# Altium footprint library USB&Type C.PcbLib: 17 footprints (part 1 of 2)
Each footprint in its own frame and in the unit in brackets; x right, y up, seen from the top. Pads: shape width x height; smd on the part's side, far side on the other; paste and mask are expansions set on the pad; w line width, h text height; cw(c..) or ccw(c..) is an arc to the next point about the centre after c.
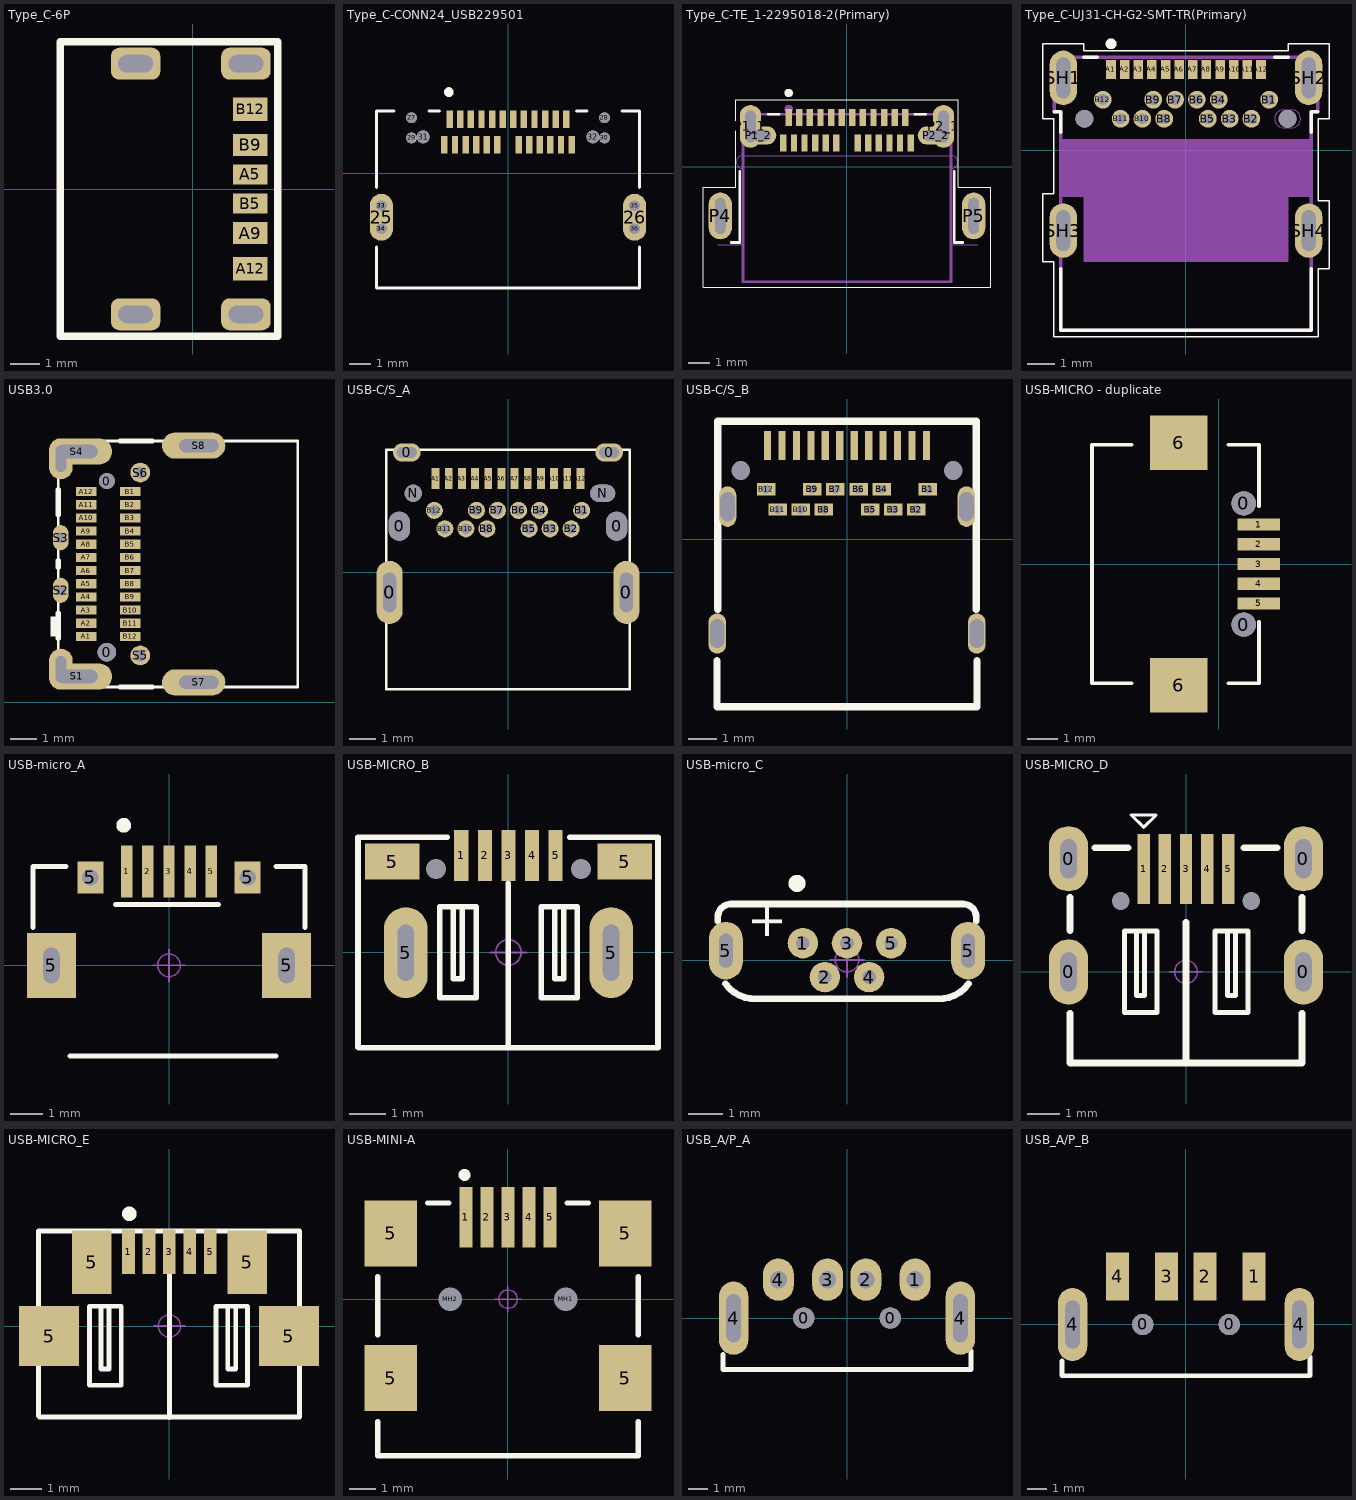
[diagram p0: the footprints below, top view; thin cyan lines are the x and y axes]

## Type_C-6P [mm]
pads (10):
  rect 1.2x0.7 smd: A5(1.975,0.5) B5(1.975,-0.5)
  rect 1.2x0.76 smd: A9(1.975,-1.52) B9(1.975,1.52)
  rect 1.2x0.8 smd: A12(1.975,-2.75) B12(1.975,2.75)
  rrect50% 1.7x1.1 hole 0.6 slot 1.2 at 0 deg: ""(-1.975,-4.32) ""(-1.975,4.32) ""(1.825,-4.32) ""(1.825,4.32)
Top Overlay:
  lines w0.254: -4.572,-5.08 2.921,-5.08 2.921,5.08 -4.572,5.08 -4.572,-5.08
3D body "USB TYPE-C 3.1smple.STEP": height 3.18, standoff -0.9, extent -4.614,-4.47 2.286,4.47

## Type_C-CONN24_USB229501 [mil]
pads (38):
  oval 43x87 smd: 25(-235.04,-81.67) 26(235.04,-81.67)
  round 20 hole 20: 27(-179.13,103.17) 28(179.13,103.17) 29(-179.13,65.73) 30(179.13,65.73) 33(-235.04,-60.17) 33(-235.04,-60.17) 34(-235.04,-103.17) 34(-235.04,-103.17) 35(235.04,-60.17) 36(235.04,-103.17)
  round 24 hole 24: 31(-157.48,67.74) 32(157.48,67.74)
  rect 12x32 smd paste+0 mask+0: A1(-108.27,100.38) A2(-88.58,100.38) A3(-68.9,100.38) A4(-49.21,100.38) A5(-29.53,100.38) A6(-9.84,100.38) A7(9.84,100.38) A8(29.53,100.38) A9(49.21,100.38) A10(68.9,100.38) A11(88.58,100.38) A12(108.27,100.38) B1(118.11,53.13) B2(98.43,53.13) B3(78.74,53.13) B4(59.06,53.13) B5(39.37,53.13) B6(19.68,53.13) B7(-19.68,53.13) B8(-39.37,53.13) B9(-59.06,53.13) B10(-78.74,53.13) B11(-98.43,53.13) B12(-118.11,53.13)
Top Overlay:
  circle w10: c-110,150.85 r4
  lines w6: -244,-137.09 -244,-213.15 244,-213.15 244,-137.09 ; -244,-26.25 -244,115.85 -212.23,115.85 ; -146.03,115.85 -127.1,115.85 ; 127.1,115.85 146.03,115.85 ; 212.23,115.85 244,115.85 244,-26.25
Bottom Overlay:
  circle w10: c-110,150.85 r4
Mechanical 13:
  circle w5: c-110,150.85 r4
Multi-Layer:
  lines w1: -189.13,65.73 -189.13,103.17 ; -179.13,55.73 -157.48,55.74 ; -169.13,103.17 -169.13,79.74 -157.48,79.74 ; 157.48,55.74 179.13,55.73 ; 157.48,79.74 169.13,79.74 169.13,103.17 ; 189.13,65.73 189.13,103.17 ; -245.04,-103.17 -245.04,-60.17 -245.04,-103.17 ; -225.04,-103.17 -225.04,-60.17 -225.04,-103.17 ; -194,-208.15 -194,19.85 194,19.85 194,-208.15 -194,-208.15 ; 225.04,-103.17 225.04,-60.17 225.04,-103.17 ; 245.04,-103.17 245.04,-60.17 245.04,-103.17
3D body "c-2295018-2-a-3d.stp": height 96.06, standoff -45.67, extent -238.97,-205.01 238.99,113.69

## Type_C-TE_1-2295018-2(Primary) [mm]
pads (30):
  rect 0.3x0.8 smd: A1(-2.75,2.315) A2(-2.25,2.315) A3(-1.75,2.315) A4(-1.25,2.315) A5(-0.75,2.315) A6(-0.25,2.315) A7(0.25,2.315) A8(0.75,2.315) A9(1.25,2.315) A10(1.75,2.315) A11(2.25,2.315) A12(2.75,2.315) B1(3,1.115) B2(2.5,1.115) B3(2,1.115) B4(1.5,1.115) B5(1,1.115) B6(0.5,1.115) B7(-0.5,1.115) B8(-1,1.115) B9(-1.5,1.115) B10(-2,1.115) B11(-2.5,1.115) B12(-3,1.115)
  oval 1.008x2.016 hole 0.5 slot 1.5 at 90 deg: P1_1(-4.55,1.905) P2_1(4.55,1.905)
  oval 1.716x0.858 hole 0.5 slot 1.2 at 0 deg: P1_2(-4.191,1.48) P2_2(4.191,1.48)
  oval 1.1x2.2 hole 0.5 slot 1.7 at 90 deg: P4(-5.97,-2.315) P5(5.97,-2.315)
Top Overlay:
  circle w0.2: c-2.75,3.48 r0.1
  lines w0.05: -6.77,-5.67 -6.77,-0.965 -5.25,-0.965 -5.25,3.165 5.25,3.165 5.25,-0.965 6.77,-0.965 6.77,-5.67 -6.77,-5.67
  lines w0.127: -5.45,-3.565 -5.05,-3.565 -5.05,-0.215 ; -3.7,2.48 -3.2,2.48 ; 3.2,2.48 3.7,2.48 ; 5.05,-0.215 5.05,-3.565 5.45,-3.565
Mechanical 1:
  lines w0: -6.09,-3.675 -4.92,-3.675 -4.92,-0.075 cw(c-4.92,0.225) -5.22,0.225 cw(c-4.92,0.225) -4.92,0.525 4.93,0.525 cw(c4.925,0.23) 5.22,0.225 ; -4.005,1.78 -4.155,1.78 cw(c-4.15,1.93) -4.3,1.935 -4.3,2.38 ccw(c-4.55,2.38) -4.55,2.63 ccw(c-4.55,2.38) -4.8,2.38 -4.8,1.43 ccw(c-4.55,1.43) -4.55,1.18 -4,1.18 ccw(c-4,1.48) -3.7,1.48 ; -4.002,1.78 cw(c-4.002,1.478) -3.7,1.478 ; 4.919,-0.075 ccw(c4.929,0.216) 5.22,0.226 ; 4.92,-0.075 4.92,-3.675 6.17,-3.675 ; -6.22,-2.865 ccw(c-5.97,-2.865) -5.97,-3.115 ccw(c-5.97,-2.865) -5.72,-2.865 -5.72,-1.765 ccw(c-5.97,-1.765) -5.97,-1.515 ccw(c-5.97,-1.765) -6.22,-1.765 -6.22,-2.865 ; 3.7,1.48 ccw(c4,1.48) 4,1.18 4.55,1.18 ccw(c4.55,1.43) 4.8,1.43 4.8,2.38 ccw(c4.55,2.38) 4.55,2.63 ccw(c4.55,2.38) 4.3,2.38 4.3,1.935 cw(c4.15,1.93) 4.155,1.78 4,1.78 ccw(c4,1.48) 3.7,1.48 ; 5.72,-2.865 ccw(c5.97,-2.865) 5.97,-3.115 ccw(c5.97,-2.865) 6.22,-2.865 6.22,-1.765 ccw(c5.97,-1.765) 5.97,-1.515 ccw(c5.97,-1.765) 5.72,-1.765 5.72,-2.865
Mechanical 4:
  circle w0.2: c-2.75,2.72 r0.1
  circle w0.2: c-2.75,2.72 r0.1
  lines w0.127: -4.9,-5.42 -4.9,2.48 ; -4.9,-5.42 4.9,-5.42 ; -4.9,-5.42 -4.9,2.48 ; -4.9,-5.42 4.9,-5.42 ; -4.9,2.48 4.9,2.48 ; -4.9,2.48 4.9,2.48 ; 4.9,-5.42 4.9,2.48 ; 4.9,-5.42 4.9,2.48
3D body "c-1-2295018-2-a-3d.stp": height 2.5, standoff -1.1, extent -6.07,-5.457 6.07,2.638

## Type_C-UJ31-CH-G2-SMT-TR(Primary) [mm]
pads (30):
  rect 0.35x0.7 smd: A1(-2.75,2.955) A2(-2.25,2.955) A3(-1.75,2.955) A4(-1.25,2.955) A5(-0.75,2.955) A6(-0.25,2.955) A7(0.25,2.955) A8(0.75,2.955) A9(1.25,2.955) A10(1.75,2.955) A11(2.25,2.955) A12(2.75,2.955)
  round 0.65 hole 0.4: B1(3.05,1.845) B2(2.4,1.145) B3(1.6,1.145) B4(1.2,1.845) B5(0.8,1.145) B6(0.4,1.845) B7(-0.4,1.845) B8(-0.8,1.145) B9(-1.2,1.845) B10(-1.6,1.145) B11(-2.4,1.145) B12(-3.05,1.845)
  round 0.65 hole 0.65 unplated: None(-3.725,1.145) None(3.725,1.145)
  oval 1x2 hole 0.5 slot 1.5 at 90 deg: SH1(-4.5,2.645) SH2(4.5,2.645) SH3(-4.5,-2.955) SH4(4.5,-2.955)
Top Overlay:
  circle w0.2: c-2.75,3.895 r0.1
  lines w0.05: -5.25,-4.105 -5.25,-1.605 -4.85,-1.605 -4.85,1.145 -5.25,1.145 -5.25,3.895 -3.75,3.895 -3.75,3.645 3.75,3.645 3.75,3.895 5.25,3.895 5.25,1.145 4.85,1.145 4.85,-1.855 5.25,-1.855 5.25,-4.355 4.85,-4.355 4.85,-6.855 -4.85,-6.855 -4.85,-4.105 -5.25,-4.105
  lines w0.127: -4.825,1.395 -4.6,1.395 -4.6,0.645 ; -4.6,-4.355 -4.6,-6.605 4.6,-6.605 4.6,-4.355 ; -3.75,3.395 -3.25,3.395 ; 3.25,3.395 3.75,3.395 ; 4.6,0.645 4.6,1.395 4.825,1.395
Mechanical 1:
  lines w0: -4.75,-3.355 ccw(c-4.5,-3.355) -4.25,-3.355 -4.25,-2.555 ccw(c-4.5,-2.555) -4.75,-2.555 -4.75,-3.355 ; -4.75,2.345 ccw(c-4.5,2.345) -4.25,2.345 -4.25,2.945 ccw(c-4.5,2.945) -4.75,2.945 -4.75,2.345 ; 3.575,0.82 cw(c3.575,1.145) 3.575,1.47 3.875,1.47 cw(c3.875,1.145) 3.875,0.82 3.575,0.82 ; 4.25,-3.355 ccw(c4.5,-3.355) 4.75,-3.355 4.75,-2.555 ccw(c4.5,-2.555) 4.25,-2.555 4.25,-3.355 ; 4.25,2.345 ccw(c4.5,2.345) 4.75,2.345 4.75,2.945 ccw(c4.5,2.945) 4.25,2.945 4.25,2.345
Mechanical 4:
  region: -4.6,0.395 4.6,0.395 4.6,-1.705 3.75,-1.705 3.75,-4.105 -3.75,-4.105 -3.75,-1.705 -4.6,-1.705
  region: -4.6,0.395 4.6,0.395 4.6,-1.705 3.75,-1.705 3.75,-4.105 -3.75,-4.105 -3.75,-1.705 -4.6,-1.705
  region: -4.6,0.395 4.6,0.395 4.6,-1.705 3.75,-1.705 3.75,-4.105 -3.75,-4.105 -3.75,-1.705 -4.6,-1.705
  region: -4.6,0.395 4.6,0.395 4.6,-1.705 3.75,-1.705 3.75,-4.105 -3.75,-4.105 -3.75,-1.705 -4.6,-1.705
  lines w0.127: -4.825,1.395 -4.825,3.395 ; -4.825,1.395 -4.6,1.395 ; -4.825,1.395 -4.825,3.395 ; -4.825,1.395 -4.6,1.395 ; -4.825,3.395 4.825,3.395 ; -4.825,3.395 4.825,3.395 ; -4.6,-6.605 -4.6,1.395 ; -4.6,-6.605 4.6,-6.605 ; -4.6,-6.605 -4.6,1.395 ; -4.6,-6.605 4.6,-6.605 ; 4.6,-6.605 4.6,1.395 ; 4.6,-6.605 4.6,1.395 ; 4.6,1.395 4.825,1.395 ; 4.6,1.395 4.825,1.395 ; 4.825,1.395 4.825,3.395 ; 4.825,1.395 4.825,3.395
3D body "CUI_UJ31-CH-G2-SMT-TR.step": height 4.5, standoff -1.16, extent -4.812,-6.657 4.9,3.343

## USB3.0 [mm]
pads (42):
  round 0.7 hole 0.7 unplated mask+0: 0(27.283,1.908)
  round 0.6 hole 0.6 unplated mask+0: 0(27.283,8.408)
  rect 0.77x0.35 smd: A1(26.498,2.508) A2(26.498,3.008) A3(26.498,3.508) A4(26.498,4.008) A5(26.498,4.508) A6(26.498,5.008) A7(26.498,5.508) A8(26.498,6.008) A9(26.498,6.508) A10(26.498,7.008) A11(26.498,7.508) A12(26.498,8.008) B1(28.168,8.008) B2(28.168,7.508) B3(28.168,7.008) B4(28.168,6.508) B5(28.168,6.008) B6(28.168,5.508) B7(28.168,5.008) B8(28.168,4.508) B9(28.168,4.008) B10(28.168,3.508) B11(28.168,3.008) B12(28.168,2.508)
  oval 1.6x0.5 hole 0.5 slot 1.6 at 0 deg mask+0: S1(26.133,0.983) S4(26.133,9.533)
  oval 0.6x0.95 hole 0.4: S2(25.533,4.258) S3(25.533,6.258)
  round 0.75 hole 0.45: S5(28.553,1.783) S6(28.553,8.733)
  oval 1.5x0.5 hole 0.5 slot 1.5 at 0 deg mask+0: S7(30.783,0.758) S8(30.783,9.758)
  oval 0.4x1.055 hole 0.4 slot 1 at 90 deg mask+0: ""(25.533,1.26) ""(25.533,9.255)
  oval 0.9x1.555 all layers, no hole: ""(25.533,1.26) ""(25.533,9.255)
  oval 2.4x1 all layers, no hole: ""(26.283,0.983) ""(26.283,9.533) ""(30.583,0.758) ""(30.583,9.758)
Top Overlay:
  region: 25.433,2.508 25.433,3.258 25.133,3.258 25.133,2.508
  lines w0.1: 25.433,0.583 34.533,0.583 34.533,9.933 25.433,9.933 25.433,0.583
  lines w0.2: 25.433,2.438 25.433,3.388 ; 25.433,5.128 25.433,5.388 ; 25.433,7.128 25.433,8.078 ; 27.79,0.583 29.003,0.583 ; 27.79,9.933 29.003,9.933

## USB-C/S_A [mm]
pads (32):
  oval 1x2.4 hole 0.5 slot 1.5 at 90 deg: 0(-4.5,-0.765) 0(4.5,-0.765)
  oval 0.8x1.1 hole 0.8 slot 1.1 at 90 deg: 0(-4.13,1.75) 0(4.13,1.75)
  oval 1.05x0.7 hole 0.4 slot 0.75 at 0 deg: 0(-3.845,4.55) 0(3.845,4.55)
  rect 0.3x0.8 smd: A1(-2.75,3.56) A2(-2.25,3.56) A3(-1.75,3.56) A4(-1.25,3.56) A5(-0.75,3.56) A6(-0.25,3.56) A7(0.25,3.56) A8(0.75,3.56) A9(1.25,3.56) A10(1.75,3.56) A11(2.25,3.56) A12(2.75,3.56)
  round 0.65 hole 0.4: B1(2.8,2.35) B2(2.4,1.65) B3(1.6,1.65) B4(1.2,2.35) B5(0.8,1.65) B6(0.4,2.35) B7(-0.4,2.35) B8(-0.8,1.65) B9(-1.2,2.35) B10(-1.6,1.65) B11(-2.4,1.65) B12(-2.8,2.35)
  round 0.65 hole 0.65: N(-3.6,3)
  oval 0.95x0.65 hole 0.65 slot 0.95 at 0 deg: N(3.6,3)
Top Overlay:
  lines w0.1: -4.625,-4.45 -4.625,4.65 4.625,4.65 4.625,-4.45 -4.625,-4.45
3D body "type-Cĸ?": height 3.35, standoff -0.9, extent -4.625,-4.45 4.625,4.65

## USB-C/S_B [mm]
pads (30):
  rect 0.25x1 smd: A1(-2.75,3.253) A2(-2.25,3.253) A3(-1.75,3.253) A4(-1.25,3.253) A5(-0.75,3.253) A6(-0.25,3.253) A7(0.25,3.253) A8(0.75,3.253) A9(1.25,3.253) A10(1.75,3.253) A11(2.25,3.253) A12(2.75,3.253)
  rect 0.64x0.42 hole 0.3: B1(2.8,1.737) B2(2.4,1.037) B3(1.6,1.037) B4(1.2,1.737) B5(0.8,1.037) B6(0.4,1.737) B7(-0.4,1.737) B8(-0.8,1.037) B9(-1.2,1.737) B10(-1.6,1.037) B11(-2.4,1.037) B12(-2.8,1.737)
  oval 0.6x1.4 hole 0.5 slot 1 at 90 deg: ""(-4.49,-3.253) ""(-4.13,1.137) ""(4.13,1.137) ""(4.49,-3.253)
  round 0 hole 0.65: ""(-3.675,2.387) ""(3.675,2.387)
Top Overlay:
  lines w0.254: -4.5,-4.2 -4.5,-5.783 4.5,-5.783 4.5,-4.2 ; -4.475,-2.413 -4.475,4.087 4.475,4.087 4.475,-2.413

## USB-MICRO - duplicate [mm]
pads (9):
  round 0.8 hole 0.8: 0(0.825,2) 0(0.825,-2)
  rect 1.4x0.4 smd: 1(1.325,1.3) 2(1.325,0.65) 3(1.325,0) 4(1.325,-0.65) 5(1.325,-1.3)
  rect 1.9x1.8 smd: 6(-1.325,-4) 6(-1.325,4)
Top Overlay:
  lines w0.127: -4.183,-3.937 -2.875,-3.937 ; -4.183,-3.9 -4.183,3.9 ; -4.183,3.937 -2.875,3.937 ; 0.325,-3.937 1.325,-3.937 1.325,-1.905 ; 0.325,3.937 1.325,3.937 ; 1.325,1.905 1.325,3.9
3D body "User Library-Micro USB.STEP": height 2.72, standoff -0.22, extent -4.08,-3.99 1.35,3.99

## USB-micro_A [mm] "micro型USB ，5.7*7.8*2.5mm"
pads (9):
  rect 0.35x1.6 smd: 1(-1.3,2.9) 2(-0.65,2.9) 3(0,2.9) 4(0.65,2.9) 5(1.3,2.9)
  rect 1.5x2 hole 0.5 slot 1.1 at 90 deg: 5(-3.625,0) 5(3.625,0)
  rect 0.8x1 hole 0.5: 5(-2.425,2.71) 5(2.425,2.71)
Top Overlay:
  circle w0.254: c-1.397,4.318 r0.102
  lines w0.152: -4.191,1.168 -4.191,3.048 -3.175,3.048 ; -3.048,-2.794 3.302,-2.794 ; -1.65,1.875 1.525,1.875 ; 3.302,3.048 4.191,3.048 4.191,1.168
Mechanical 15:
  circle w0.05: c0,0 r0.35
  lines w0.05: -0.5,0 0.5,0 ; 0,-0.5 0,0.5
3D body "USB micro_A.STEP": height 2.8, standoff -0.95, extent -4.001,-2.71 4.001,2.89

## USB-MICRO_B [mm] "micro型USB ，5.9*8.2*2.5mm"
pads (11):
  round 0 hole 0.55 unplated: 0(-2,2.294) 0(2,2.294)
  rect 0.394x1.4 smd: 1(-1.295,2.667) 2(-0.648,2.667) 3(0,2.667) 4(0.648,2.667) 5(1.295,2.667)
  rect 1.5x1 smd: 5(-3.2,2.5) 5(3.2,2.5)
  oval 1.2x2.5 hole 0.45 slot 1.55 at 90 deg: 5(-2.825,-0.006) 5(2.825,-0.006)
Top Overlay:
  lines w0.15: -4.14,3.175 -1.689,3.175 ; 0,-2.629 0,1.905 ; 1.689,3.175 4.115,3.175
  lines w0.152: -4.14,-2.603 -4.14,3.175 ; -4.115,-2.629 4.089,-2.629 ; -1.524,1.257 -1.524,-0.728 -1.321,-0.728 -1.27,-0.728 -1.27,1.257 ; 1.27,1.257 1.27,-0.728 1.524,-0.728 1.524,1.257 ; 4.115,-2.629 4.115,3.175 ; -1.885,-1.243 -1.885,1.257 -0.885,1.257 -0.885,-1.243 -1.885,-1.243 ; 0.896,-1.243 1.896,-1.243 1.896,1.257 0.896,1.257 0.896,-1.243
Mechanical 15:
  circle w0.05: c0,0 r0.35
  lines w0.05: -0.5,0 0.5,0 ; 0,-0.5 0,0.5
3D body "USB micro_B.STEP": height 2.8, standoff -1.35, extent -4.001,-2.716 4.001,2.884

## USB-micro_C [mm] "micro型USB ，5.7*7.8*2.5mm"
pads (7):
  round 0.9 hole 0.4: 1(-1.3,0.5) 2(-0.65,-0.5) 3(0,0.5) 4(0.65,-0.5) 5(1.3,0.5)
  oval 1x1.7 hole 0.4 slot 1 at 90 deg: 5(-3.575,0.28) 5(3.575,0.28)
Top Overlay:
  circle w0.254: c-1.473,2.261 r0.127
  lines w0.2: -3.81,1.143 -3.81,1.27 cw(c-3.429,1.27) -3.429,1.651 -3.175,1.651 -2.794,1.651 2.794,1.651 3.175,1.651 3.429,1.651 cw(c3.429,1.27) 3.81,1.27 3.81,1.143 ; -3.587,-0.697 ccw(c-2.718,-0.076) -2.667,-1.143 ; -2.629,-1.143 -2.413,-1.143 2.413,-1.143 2.667,-1.143 ccw(c2.718,-0.076) 3.587,-0.697
  text "+" at -1.905,0.559 h1.02
Mechanical 15:
  circle w0.05: c0,0 r0.35
  lines w0.05: -0.5,0 0.5,0 ; 0,-0.5 0,0.5
3D body "USB micro_C.STEP": height 5.65, standoff -1.55, extent -4.001,-1.207 4.001,1.767

## USB-MICRO_D [mm] "micro型USB ，6.7*7.5*2.5mm"
pads (11):
  oval 1.2x2 hole 0.5 slot 1.2 at 90 deg: 0(-3.6,0) 0(-3.6,3.47) 0(3.6,0) 0(3.6,3.47)
  round 0 hole 0.55 unplated: 0(-2,2.17) 0(2,2.17)
  rect 0.381x2.15 smd: 1(-1.3,3.16) 2(-0.65,3.16) 3(0,3.16) 4(0.65,3.16) 5(1.3,3.16)
Top Overlay:
  lines w0.1: -1.681,4.811 -1.3,4.43 -0.919,4.811 -1.681,4.811
  lines w0.152: -1.524,1.257 -1.524,-0.728 -1.321,-0.728 -1.27,-0.728 -1.27,1.257 ; 1.27,1.257 1.27,-0.728 1.524,-0.728 1.524,1.257 ; -1.885,-1.243 -1.885,1.257 -0.885,1.257 -0.885,-1.243 -1.885,-1.243 ; 0.896,-1.243 1.896,-1.243 1.896,1.257 0.896,1.257 0.896,-1.243
  lines w0.203: -3.556,-1.27 -3.556,-2.794 3.556,-2.794 3.556,-1.27 ; -3.556,1.27 -3.556,2.286 ; -2.794,3.81 -1.778,3.81 ; 0,-2.75 0,1.524 ; 1.778,3.81 2.794,3.81 ; 3.556,1.27 3.556,2.286
Mechanical 15:
  circle w0.05: c0,0 r0.35
  lines w0.05: -0.5,0 0.5,0 ; 0,-0.5 0,0.5
3D body "USB micro_D.STEP": height 2.79, standoff -0.95, extent -3.985,-2.75 3.985,3.95

## USB-MICRO_E [mm] "micro型USB ，5.9*8.2*2.5mm"
pads (9):
  rect 0.4x1.4 smd: 1(-1.296,2.355) 2(-0.648,2.355) 3(0,2.355) 4(0.648,2.355) 5(1.295,2.355)
  rect 1.9x1.9 smd: 5(-3.81,-0.312) 5(3.784,-0.312)
  rect 1.25x2 smd: 5(-2.464,2.025) 5(2.464,2.025)
Top Overlay:
  circle w0.254: c-1.27,3.556 r0.102
  lines w0.152: -4.14,-2.852 -4.14,3.016 ; -4.115,-2.877 4.089,-2.877 ; -4.09,3.016 4.089,3.016 ; -2.165,0.628 -2.165,-1.357 -1.962,-1.357 -1.911,-1.357 -1.911,0.628 ; 0,-2.889 0,2.99 ; 1.848,0.628 1.848,-1.357 2.102,-1.357 2.102,0.628 ; 4.115,-2.877 4.115,3.016 ; -2.526,-1.872 -1.526,-1.872 -1.526,0.628 -2.526,0.628 -2.526,-1.872 ; 1.474,-1.872 1.474,0.628 2.474,0.628 2.474,-1.872 1.474,-1.872
Mechanical 15:
  circle w0.05: c0,0.006 r0.35
  lines w0.05: -0.5,0.006 0.5,0.006 ; 0,-0.494 0,0.506
3D body "USB-MICRO B型 ?": height 2.69, standoff -0.24, extent -3.982,-2.772 3.982,2.65

## USB-MINI-A [mm] "MINI型USB，7.9*7.5*4.1mm"
pads (11):
  rect 0.5x2.3 smd: 1(-1.6,3.108) 2(-0.8,3.108) 3(0,3.108) 4(0.8,3.108) 5(1.6,3.108)
  rect 2x2.5 smd: 5(-4.45,-3) 5(-4.45,2.5) 5(4.45,-3) 5(4.45,2.5)
  round 0.6 hole 0.9 unplated: MH1(2.2,0) MH2(-2.2,0)
Top Overlay:
  circle w0.254: c-1.651,4.721 r0.102
  lines w0.2: -4.95,-4.65 -4.95,-5.95 4.95,-5.95 4.95,-4.65 ; -4.95,-1.35 -4.95,0.85 ; -3.05,3.65 -2.25,3.65 ; 2.25,3.65 3.05,3.65 ; 4.95,-1.35 4.95,0.85
Mechanical 15:
  circle w0.05: c0,0 r0.35
  lines w0.05: -0.5,0 0.5,0 ; 0,-0.5 0,0.5
3D body "USB MINI B型 ?": height 3.95, standoff -0.7, extent -4.75,-6 4.75,3.7

## USB_A/P_A [mm] "A型USB 插头，20*13*4.5mm"
height 1.75
pads (8):
  round 1.1 hole 1.1: 0(-2.25,0) 0(2.25,0)
  oval 1.6x2.2 hole 0.9: 1(3.543,2) 2(0.987,2) 3(-1.013,2) 4(-3.569,2)
  oval 1.524x3.81 hole 0.762 slot 2.5 at 90 deg: 4(-5.9,0) 4(5.9,0)
Top Overlay:
  lines w0.254: -6.45,-1.9 -6.45,-2.667 6.45,-2.667 6.45,-1.7
3D body "USB A型 ?": height 3.25, standoff -2.52, extent -6.473,-17.9 6.473,2.105

## USB_A/P_B [mm] "A型USB 插头，20*13*4.5mm"
height 1.75
pads (8):
  round 1.1 hole 1.1: 0(-2.237,0) 0(2.263,0)
  rect 1.2x2.5 smd: 1(3.556,2.508) 2(1,2.508) 3(-1,2.508) 4(-3.556,2.508)
  oval 1.524x3.81 hole 0.762 slot 2.5 at 90 deg: 4(-5.887,0) 4(5.913,0)
Top Overlay:
  lines w0.254: -6.437,-1.9 -6.437,-2.667 6.463,-2.667 6.463,-1.7
3D body "USB A型 ?": height 3.25, standoff -2.52, extent -6.46,-17.9 6.487,2.7